# Altium footprint library CMRat_GEN2.8.PcbLib: 50 footprints (part 4 of 4)
Each footprint in its own frame and in the unit in brackets; x right, y up, seen from the top. Pads: shape width x height; smd on the part's side, far side on the other; paste and mask are expansions set on the pad; w line width, h text height; cw(c..) or ccw(c..) is an arc to the next point about the centre after c.
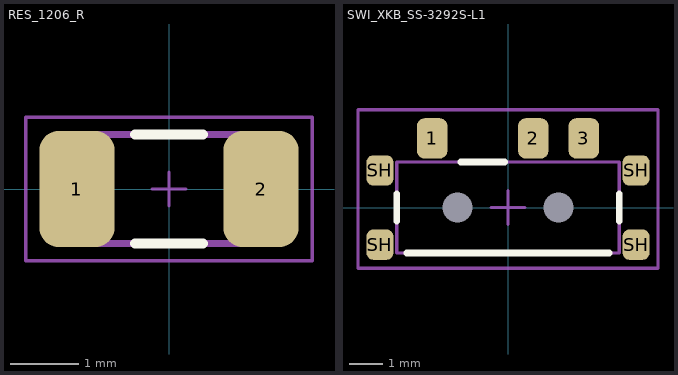
[diagram p3: the footprints below, top view; thin cyan lines are the x and y axes]

## RES_1206_R [mm]
height 10.7
pads (2):
  rrect50% 1.1x1.7 smd: 1(-1.35,0) 2(1.35,0)
Top Overlay:
  lines w0.15: -0.5,-0.8 0.5,-0.8 ; -0.5,0.8 0.5,0.8
Mechanical 19:
  lines w0.1: -1.6,-0.8 -1.6,0.8 1.6,0.8 1.6,-0.8 -1.6,-0.8
  text ".Designator" at -1.95,1.2 h2
Mechanical 23:
  lines w0.05: -0.25,0 0.25,0 ; 0,-0.25 0,0.25 ; -2.1,-1.05 -2.1,1.05 2.1,1.05 2.1,-1.05 -2.1,-1.05
3D body "RES_1206.step": height 0.6, standoff 0, extent -1.6,-0.8 1.6,0.8

## SWI_XKB_SS-3292S-L1 [mm]
height 3.2
pads (9):
  rrect50% 0.9x1.2 smd: 1(-2.25,2.05) 2(0.75,2.05) 3(2.25,2.05)
  round 0 hole 0.9 unplated mask+0.1: MH1(-1.5,0) MH1(1.5,0)
  rrect50% 0.8x0.9 smd: SH(-3.8,-1.1) SH(-3.8,1.1) SH(3.8,-1.1) SH(3.8,1.1)
Top Overlay:
  lines w0.2: -3.3,-0.4 -3.3,0.4 ; -3,-1.35 3,-1.35 ; -1.4,1.35 -0.1,1.35 ; 3.3,-0.4 3.3,0.4
Mechanical 19:
  lines w0.1: -3.3,-1.35 3.3,-1.35 3.3,1.35 -3.3,1.35 -3.3,-1.35
  text ".Designator" at 5.9,-1.75 h1.6
Mechanical 23:
  lines w0.1: -0.5,0 0.5,0 ; 0,-0.5 0,0.5 ; -4.45,-1.8 4.45,-1.8 4.45,2.9 -4.45,2.9 -4.45,-1.8
3D body "XKB_ss-3292s-l1-b.stp": height 2.9, standoff -0.5, extent -3.9,-1.375 3.9,2.375